# Altium footprint library E-Stall_lib.PcbLib: 112 footprints (part 7 of 7)
Each footprint in its own frame and in the unit in brackets; x right, y up, seen from the top. Pads: shape width x height; smd on the part's side, far side on the other; paste and mask are expansions set on the pad; w line width, h text height; cw(c..) or ccw(c..) is an arc to the next point about the centre after c.
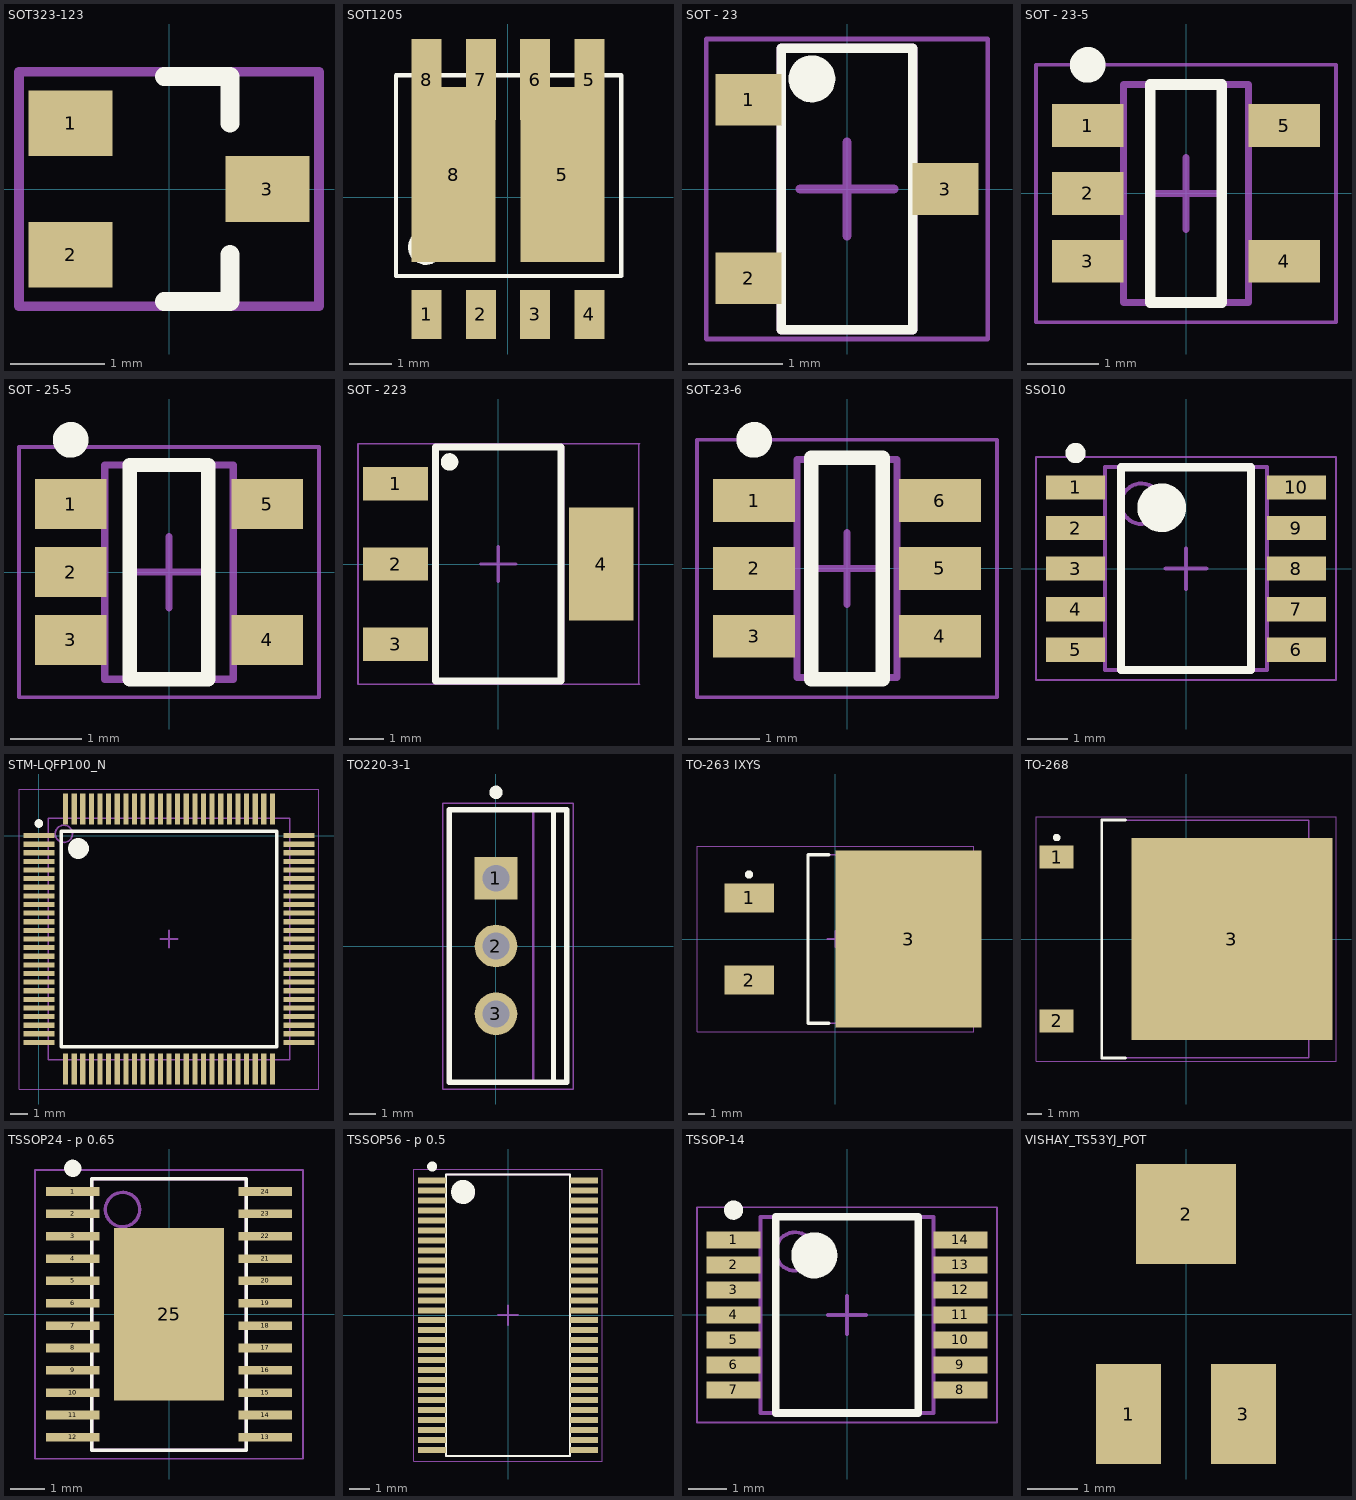
[diagram p6: the footprints below, top view; thin cyan lines are the x and y axes]

## SOT323-123 [mm] "SOT23 WITH A/K PIN NUMBERS"
pads (3):
  rect 0.9x0.7 smd: 1(-1.05,0.7) 2(-1.05,-0.7) 3(1.05,0)
Top Overlay:
  lines w0.2: -0.05,-1.2 0.65,-1.2 0.65,-0.7 ; -0.05,1.2 0.65,1.2 0.65,0.7
Mechanical 15:
  lines w0.102: -1.6,-1.25 1.6,-1.25 1.6,1.25 -1.6,1.25 -1.6,-1.25
3D body: height 1.33, standoff 1.3, extent -0.415,0.777 -0.162,1.03
3D body: height 0.22, standoff 0, extent -1.152,-0.908 -0.923,-0.502
3D body: height 0.62, standoff 0, extent -0.987,-0.908 -0.758,-0.502
3D body: height 0.62, standoff 0.4, extent -0.771,-0.908 -0.593,-0.502
3D body: height 0.62, standoff 0.4, extent -0.771,0.497 -0.593,0.903
3D body: height 0.62, standoff 0, extent -0.987,0.497 -0.758,0.903
3D body: height 0.22, standoff 0, extent -1.152,0.497 -0.923,0.903
3D body: height 1.3, standoff 0.1, extent -0.593,-1.175 0.6,1.175
3D body: height 0.62, standoff 0.4, extent 0.578,-0.218 0.756,0.188
3D body: height 0.62, standoff 0, extent 0.743,-0.218 0.972,0.188
3D body: height 0.22, standoff 0, extent 0.908,-0.218 1.137,0.188

## SOT1205 [mm]
pads (10):
  rect 0.7x1.15 smd mask+0.07: 1(-1.905,-2.75) 2(-0.635,-2.75) 3(0.635,-2.75) 4(1.905,-2.75)
  rect 1.968x4.1 smd paste-1 mask+0.07: 5(1.275,0.525) 8(-1.275,0.525)
  rect 0.7x1.9 smd mask+0.07: 5(1.905,2.75) 6(0.635,2.75) 7(-0.635,2.75) 8(-1.905,2.75)
Top Overlay:
  circle w0.1: c-1.925,-1.175 r0.365
  lines w0.1: -2.62,-1.85 -2.62,2.85 2.65,2.85 2.65,-1.85 -2.62,-1.85
Top Paste:
  rectangle: 0.625,-1.175 1.895,-0.175
  rectangle: 0.625,0.525 1.895,1.525
  rectangle: -1.925,-1.175 -0.655,-0.175
  rectangle: -1.92,0.525 -0.65,1.525
3D body "SOT1205.step": height 1.07, standoff -0.03, extent -2.55,-2.909 2.55,3.251

## SOT - 23 [mm] "SOT23, 3-Leads, Body 2,90x2,30mm, Pitch 0,95mm, IPC High Density"
height 1.1
pads (3):
  rect 0.7x0.55 smd: 1(-1.05,0.95) 2(-1.05,-0.95) 3(1.05,0)
Top Overlay:
  circle w0.25: c-0.375,1.175 r0.125
  lines w0.1: -0.7,-1.5 -0.7,1.5 0.7,1.5 0.7,-1.5 -0.7,-1.5
Mechanical 13:
  lines w0.1: -0.7,-1.5 0.7,-1.5 0.7,1.5 -0.7,1.5 -0.7,-1.5
Mechanical 15:
  lines w0.05: -1.5,-1.6 1.5,-1.6 1.5,1.6 -1.5,1.6 -1.5,-1.6
  lines w0.1: -0.5,0 0.5,0 ; 0,-0.5 0,0.5
3D body "SOT95P230X110-3L.step": height 1.1, standoff 0, extent -1.3,-1.5 1.3,1.5

## SOT - 23-5 [mm] "SOT23, 5-Leads, Body 2,90x2,80mm, Pitch 0,95mm, IPC Medium Density"
height 1.45
pads (5):
  rect 1x0.6 smd: 1(-1.375,0.95) 2(-1.375,0) 3(-1.375,-0.95) 4(1.375,-0.95) 5(1.375,0.95)
Top Overlay:
  circle w0.25: c-1.375,1.8 r0.125
  lines w0.15: -0.5,-1.525 0.5,-1.525 0.5,1.525 -0.5,1.525 -0.5,-1.525
Mechanical 13:
  lines w0.1: -0.875,-1.525 -0.875,1.525 0.875,1.525 0.875,-1.525 -0.875,-1.525
Mechanical 15:
  lines w0.05: -2.1,-1.8 -2.1,1.8 2.1,1.8 2.1,-1.8 -2.1,-1.8
  lines w0.1: -0.5,0 0.5,0 ; 0,-0.5 0,0.5
3D body "SOT - 23-5.STEP": height 1.44, standoff -0.01, extent -1.5,-1.525 1.5,1.525

## SOT - 25-5 [mm] "SOT25, 5-Leads"
height 1.3
pads (5):
  rect 1x0.7 smd: 1(-1.375,0.95) 2(-1.375,0) 3(-1.375,-0.95) 4(1.375,-0.95) 5(1.375,0.95)
Top Overlay:
  circle w0.25: c-1.375,1.85 r0.125
  lines w0.2: -0.55,-1.5 -0.55,1.5 0.55,1.5 0.55,-1.5 -0.55,-1.5
Mechanical 13:
  lines w0.1: -0.9,-1.5 0.9,-1.5 0.9,1.5 -0.9,1.5 -0.9,-1.5
Mechanical 15:
  lines w0.05: -2.1,-1.75 2.1,-1.75 2.1,1.75 -2.1,1.75 -2.1,-1.75
  lines w0.1: -0.5,0 0.5,0 ; 0,-0.5 0,0.5
3D body "SOT25-5.step": height 1.3, standoff 0, extent -1.5,-1.5 1.5,1.5

## SOT - 223 [mm] "SOT223, 4-Leads, Body 6,50x7,00mm (avg), Pitch 2,30mm, IPC High Density"
height 1.75
pads (4):
  rect 1.85x0.95 smd: 1(-2.95,2.3) 2(-2.95,0) 3(-2.95,-2.3)
  rect 1.85x3.25 smd: 4(2.95,0)
Top Overlay:
  circle w0.25: c-1.4,2.925 r0.125
  lines w0.2: -1.8,-3.35 1.8,-3.35 1.8,3.35 -1.8,3.35 -1.8,-3.35
Mechanical 13:
  lines w0.1: -1.85,-3.35 1.85,-3.35 1.85,3.35 -1.85,3.35 -1.85,-3.35
Mechanical 15:
  lines w0.05: 4.025,-3.45 4.025,3.45 ; 4.05,-3.45 -4.025,-3.45 -4.025,3.45 4.05,3.45
  lines w0.1: -0.5,0 0.5,0 ; 0,-0.5 0,0.5
3D body "SOT230P700X175-4L.step": height 1.75, standoff 0, extent -3.5,-3.35 3.5,3.35

## SOT-23-6 [mm] "SOT23, 6-Leads, Body 2,90x2,80mm, Pitch 0,95mm, IPC Medium Density"
height 1.45
pads (6):
  rect 1.15x0.6 smd: 1(-1.3,0.95) 2(-1.3,0) 3(-1.3,-0.95) 4(1.3,-0.95) 5(1.3,0) 6(1.3,0.95)
Top Overlay:
  circle w0.25: c-1.3,1.8 r0.125
  lines w0.2: -0.5,-1.55 0.5,-1.55 0.5,1.55 -0.5,1.55 -0.5,-1.55
Mechanical 13:
  lines w0.1: -0.7,-1.525 -0.7,1.525 0.7,1.525 0.7,-1.525 -0.7,-1.525
Mechanical 15:
  lines w0.05: -2.1,-1.8 -2.1,1.8 2.1,1.8 2.1,-1.8 -2.1,-1.8
  lines w0.1: -0.5,0 0.5,0 ; 0,-0.5 0,0.5
3D body "SOT-23-6.step": height 1.45, standoff 0, extent -1.5,-1.525 1.5,1.525

## SSO10 [mm] "SSO10, 10-Leads, Body 4,90x3,90mm, Pitch 1,00mm, IPC Medium Density"
height 1.75
pads (10):
  rect 1.45x0.6 smd: 1(-2.725,2) 2(-2.725,1) 3(-2.725,0) 4(-2.725,-1) 5(-2.725,-2) 6(2.725,-2) 7(2.725,-1) 8(2.725,0) 9(2.725,1) 10(2.725,2)
Top Overlay:
  circle w0.25: c-2.725,2.85 r0.125
  circle w0.6: c-0.6,1.5 r0.3
  lines w0.2: -1.6,-2.5 -1.6,2.5 1.6,2.5 1.6,-2.5 -1.6,-2.5
Mechanical 13:
  circle w0.1: c-1.1,1.6 r0.5
  lines w0.1: -2,-2.5 -2,2.5 2,2.5 2,-2.5 -2,-2.5
Mechanical 15:
  lines w0.05: -3.7,-2.75 -3.7,2.75 3.7,2.75 3.7,-2.75 -3.7,-2.75
  lines w0.1: -0.5,0 0.5,0 ; 0,-0.5 0,0.5
3D body "SSO10.step": height 1.75, standoff 0, extent -3,-2.5 3,2.5

## STM-LQFP100_N [mm]
pads (100):
  rect 1.8x0.3 smd mask+0.05: 1(0,0) 2(0,-0.5) 3(0,-1) 4(0,-1.5) 5(0,-2) 6(0,-2.5) 7(0,-3) 8(0,-3.5) 9(0,-4) 10(0,-4.5) 11(0,-5) 12(0,-5.5) 13(0,-6) 14(0,-6.5) 15(0,-7) 16(0,-7.5) 17(0,-8) 18(0,-8.5) 19(0,-9) 20(0,-9.5) 21(0,-10) 22(0,-10.5) 23(0,-11) 24(0,-11.5) 25(0,-12) 51(15.1,-12) 52(15.1,-11.5) 53(15.1,-11) 54(15.1,-10.5) 55(15.1,-10) 56(15.1,-9.5) 57(15.1,-9) 58(15.1,-8.5) 59(15.1,-8) 60(15.1,-7.5) 61(15.1,-7) 62(15.1,-6.5) 63(15.1,-6) 64(15.1,-5.5) 65(15.1,-5) 66(15.1,-4.5) 67(15.1,-4) 68(15.1,-3.5) 69(15.1,-3) 70(15.1,-2.5) 71(15.1,-2) 72(15.1,-1.5) 73(15.1,-1) 74(15.1,-0.5) 75(15.1,0)
  rect 0.3x1.8 smd mask+0.05: 26(1.55,-13.55) 27(2.05,-13.55) 28(2.55,-13.55) 29(3.05,-13.55) 30(3.55,-13.55) 31(4.05,-13.55) 32(4.55,-13.55) 33(5.05,-13.55) 34(5.55,-13.55) 35(6.05,-13.55) 36(6.55,-13.55) 37(7.05,-13.55) 38(7.55,-13.55) 39(8.05,-13.55) 40(8.55,-13.55) 41(9.05,-13.55) 42(9.55,-13.55) 43(10.05,-13.55) 44(10.55,-13.55) 45(11.05,-13.55) 46(11.55,-13.55) 47(12.05,-13.55) 48(12.55,-13.55) 49(13.05,-13.55) 50(13.55,-13.55) 76(13.55,1.55) 77(13.05,1.55) 78(12.55,1.55) 79(12.05,1.55) 80(11.55,1.55) 81(11.05,1.55) 82(10.55,1.55) 83(10.05,1.55) 84(9.55,1.55) 85(9.05,1.55) 86(8.55,1.55) 87(8.05,1.55) 88(7.55,1.55) 89(7.05,1.55) 90(6.55,1.55) 91(6.05,1.55) 92(5.55,1.55) 93(5.05,1.55) 94(4.55,1.55) 95(4.05,1.55) 96(3.55,1.55) 97(3.05,1.55) 98(2.55,1.55) 99(2.05,1.55) 100(1.55,1.55)
Top Overlay:
  circle w0.6: c2.3,-0.75 r0.3
  circle w0.25: c0,0.7 r0.125
  lines w0.2: 1.3,-12.25 13.8,-12.25 13.8,0.25 1.3,0.25 1.3,-12.25
Mechanical 13:
  circle w0.1: c1.45,0.1 r0.5
  lines w0.1: 0.55,-13 14.55,-13 14.55,1 0.55,1 0.55,-13
Mechanical 15:
  lines w0.05: -1.15,-14.7 16.25,-14.7 16.25,2.7 -1.15,2.7 -1.15,-14.7
  lines w0.1: 7.05,-6 8.05,-6 ; 7.55,-6.5 7.55,-5.5
3D body: height 1.6, standoff 0.05, extent 0.55,-13 14.55,1

## TO220-3-1 [mm] "FM, 3-Leads, Body 10x4.4mm, Pitch 2.54mm"
height 20.7
pads (3):
  rect 1.6x1.6 hole 1: 1(0,2.54)
  round 1.6 hole 1: 2(0,0) 3(0,-2.54)
Top Overlay:
  circle w0.25: c0,5.75 r0.125
  lines w0.2: 2.15,-5.1 2.15,5.1 ; -1.75,-5.1 2.65,-5.1 2.65,5.1 -1.75,5.1 -1.75,-5.1
Mechanical 13:
  lines w0.1: 1.4,-5.1 1.4,5.1 ; -1.75,-5.1 -1.75,5.1 2.65,5.1 2.65,-5.1 -1.75,-5.1
Mechanical 15:
  lines w0.05: -2,-5.35 -2,5.35 2.9,5.35 2.9,-5.35 -2,-5.35
  lines w0.1: -0.5,0 0.5,0 ; 0,-0.5 0,0.5
3D body: height 4.35, standoff 0, extent -0.25,2.015 0.25,3.065
3D body: height 0, standoff -1.6, extent -0.25,2.165 0.25,2.915
3D body: height 4.35, standoff 0, extent -0.25,-0.525 0.25,0.525
3D body: height 0, standoff -1.6, extent -0.25,-0.375 0.25,0.375
3D body: height 4.35, standoff 0, extent -0.25,-3.065 0.25,-2.015
3D body: height 0, standoff -1.6, extent -0.25,-2.915 0.25,-2.165
3D body: height 14.3, standoff 4.35, extent -1.75,-5.1 2.65,5.1
3D body: height 16.08, standoff 14.3, extent 1.4,-4.95 2.65,4.95
3D body: height 16.12, standoff 16.08, extent 1.4,0.356 2.65,4.95
3D body: height 16.12, standoff 16.08, extent 1.4,-4.95 2.65,-0.356
3D body: height 19.73, standoff 19.69, extent 1.4,0.356 2.65,4.95
3D body: height 19.73, standoff 19.69, extent 1.4,-4.95 2.65,-0.356
3D body: height 16.22, standoff 16.11, extent 1.4,0.698 2.65,4.95
3D body: height 16.22, standoff 16.11, extent 1.4,-4.95 2.65,-0.698
3D body: height 19.69, standoff 19.59, extent 1.4,0.698 2.65,4.95
3D body: height 19.69, standoff 19.59, extent 1.4,-4.95 2.65,-0.698
3D body: height 16.39, standoff 16.21, extent 1.4,1.014 2.65,4.95
3D body: height 16.39, standoff 16.21, extent 1.4,-4.95 2.65,-1.014
3D body: height 19.59, standoff 19.42, extent 1.4,1.014 2.65,4.95
3D body: height 19.59, standoff 19.42, extent 1.4,-4.95 2.65,-1.014
3D body: height 16.61, standoff 16.38, extent 1.4,1.29 2.65,4.95
3D body: height 16.61, standoff 16.38, extent 1.4,-4.95 2.65,-1.29
3D body: height 19.42, standoff 19.19, extent 1.4,1.29 2.65,4.95
3D body: height 19.42, standoff 19.19, extent 1.4,-4.95 2.65,-1.29
3D body: height 16.89, standoff 16.61, extent 1.4,1.517 2.65,4.95
3D body: height 16.89, standoff 16.61, extent 1.4,-4.95 2.65,-1.517
3D body: height 19.2, standoff 18.91, extent 1.4,1.517 2.65,4.95
3D body: height 19.2, standoff 18.91, extent 1.4,-4.95 2.65,-1.517
3D body: height 17.21, standoff 16.89, extent 1.4,1.686 2.65,4.95
3D body: height 17.21, standoff 16.89, extent 1.4,-4.95 2.65,-1.686
3D body: height 18.92, standoff 18.6, extent 1.4,1.686 2.65,4.95
3D body: height 18.92, standoff 18.6, extent 1.4,-4.95 2.65,-1.686
3D body: height 17.55, standoff 17.2, extent 1.4,1.79 2.65,4.95
3D body: height 17.55, standoff 17.2, extent 1.4,-4.95 2.65,-1.79
3D body: height 18.6, standoff 18.26, extent 1.4,1.79 2.65,4.95
3D body: height 18.6, standoff 18.26, extent 1.4,-4.95 2.65,-1.79
3D body: height 17.9, standoff 17.54, extent 1.4,1.825 2.65,4.95
3D body: height 17.9, standoff 17.54, extent 1.4,-4.95 2.65,-1.825
3D body: height 18.26, standoff 17.9, extent 1.4,1.825 2.65,4.95
3D body: height 18.26, standoff 17.9, extent 1.4,-4.95 2.65,-1.825
3D body: height 20.7, standoff 19.73, extent 1.4,-4.95 2.65,4.95

## TO-263 IXYS [mm] "IXYS TO-263 IXTA"
height 4.83
pads (3):
  rect 3.05x1.78 smd: 1(-5.335,2.54) 2(-5.335,-2.54)
  rect 9.02x10.92 smd: 3(4.51,0)
Top Overlay:
  circle w0.25: c-5.335,3.98 r0.125
  lines w0.2: -0.4,-5.2 -1.7,-5.2 -1.7,5.2 -0.4,5.2
Top Assembly:
  lines w0.1: -1.7,-5.2 -1.7,5.2 7.95,5.2 7.95,-5.2 -1.7,-5.2
Top Courtyard:
  lines w0.05: -8.55,-5.725 -8.55,5.725 8.55,5.725 8.55,-5.725 -8.55,-5.725
  lines w0.1: -0.5,0 0.5,0 ; 0,-0.5 0,0.5
3D body "TO-263 IXYS.step": height 4.83, standoff 0, extent -6.477,-5.193 8.768,5.207

## TO-268 [mm] "D3-PAK, 3-Pads, Body 10,10x11,39mm (max), IPC Medium Density"
height 5.1
pads (3):
  rect 2.3x1.55 smd: 1(-8.75,5.54) 2(-8.75,-5.54)
  rect 13.6x13.7 smd: 3(3.1,0)
Top Overlay:
  circle w0.25: c-8.75,6.865 r0.125
  lines w0.2: -4.1,-8.05 -5.7,-8.05 -5.7,8.05 -4.1,8.05
Mechanical 13:
  lines w0.1: -5.7,-8.025 8.3,-8.025 8.3,8.025 -5.7,8.025 -5.7,-8.025
Mechanical 15:
  lines w0.05: -10.15,-8.275 10.15,-8.275 10.15,8.275 -10.15,8.275 -10.15,-8.275
  lines w0.1: -0.5,0 0.5,0 ; 0,-0.5 0,0.5
3D body "TO-268.step": height 5.35, standoff 0, extent -9.3,-8 9.6,8.05

## TSSOP24 - p 0.65 [mm]
pads (25):
  rect 1.55x0.25 smd: 1(-2.8,3.575) 2(-2.8,2.925) 3(-2.8,2.275) 4(-2.8,1.625) 5(-2.8,0.975) 6(-2.8,0.325) 7(-2.8,-0.325) 8(-2.8,-0.975) 9(-2.8,-1.625) 10(-2.8,-2.275) 11(-2.8,-2.925) 12(-2.8,-3.575) 13(2.8,-3.575) 14(2.8,-2.925) 15(2.8,-2.275) 16(2.8,-1.625) 17(2.8,-0.975) 18(2.8,-0.325) 19(2.8,0.325) 20(2.8,0.975) 21(2.8,1.625) 22(2.8,2.275) 23(2.8,2.925) 24(2.8,3.575)
  rect 3.2x5.02 smd paste+0: 25(0,0)
Top Overlay:
  circle w0.25: c-2.8,4.25 r0.125
  lines w0.1: -2.25,-3.95 -2.25,3.95 2.25,3.95 2.25,-3.95 -2.25,-3.95
Mechanical 13:
  circle w0.1: c-1.35,3.05 r0.5
  lines w0.1: -2.25,-3.95 -2.25,3.95 2.25,3.95 2.25,-3.95 -2.25,-3.95
Mechanical 15:
  lines w0.05: -3.9,-4.2 -3.9,4.2 3.9,4.2 3.9,-4.2 -3.9,-4.2
  lines w0.1: -0.5,0 0.5,0 ; 0,-0.5 0,0.5
3D body: height 1.2, standoff 0, extent 0,0 0,0
3D body "PW0024A.stp": height 1.13, standoff 0, extent -3.2,-3.9 3.2,3.9

## TSSOP56 - p 0.5 [mm]
height 1.1
pads (56):
  rect 1.4x0.3 smd mask+0.01: 1(-3.8,6.75) 2(-3.8,6.25) 3(-3.8,5.75) 4(-3.8,5.25) 5(-3.8,4.75) 6(-3.8,4.25) 7(-3.8,3.75) 8(-3.8,3.25) 9(-3.8,2.75) 10(-3.8,2.25) 11(-3.8,1.75) 12(-3.8,1.25) 13(-3.8,0.75) 14(-3.8,0.25) 15(-3.8,-0.25) 16(-3.8,-0.75) 17(-3.8,-1.25) 18(-3.8,-1.75) 19(-3.8,-2.25) 20(-3.8,-2.75) 21(-3.8,-3.25) 22(-3.8,-3.75) 23(-3.8,-4.25) 24(-3.8,-4.75) 25(-3.8,-5.25) 26(-3.8,-5.75) 27(-3.8,-6.25) 28(-3.8,-6.75) 29(3.8,-6.75) 30(3.8,-6.25) 31(3.8,-5.75) 32(3.8,-5.25) 33(3.8,-4.75) 34(3.8,-4.25) 35(3.8,-3.75) 36(3.8,-3.25) 37(3.8,-2.75) 38(3.8,-2.25) 39(3.8,-1.75) 40(3.8,-1.25) 41(3.8,-0.75) 42(3.8,-0.25) 43(3.8,0.25) 44(3.8,0.75) 45(3.8,1.25) 46(3.8,1.75) 47(3.8,2.25) 48(3.8,2.75) 49(3.8,3.25) 50(3.8,3.75) 51(3.8,4.25) 52(3.8,4.75) 53(3.8,5.25) 54(3.8,5.75) 55(3.8,6.25) 56(3.8,6.75)
Top Overlay:
  circle w0.6: c-2.25,6.175 r0.3
  circle w0.25: c-3.8,7.45 r0.125
  lines w0.1: -3.1,-7.05 -3.1,7.05 3.1,7.05 3.1,-7.05 -3.1,-7.05
Mechanical 13:
  circle w0.1: c-2.2,6.15 r0.5
  lines w0.1: -3.1,-7.05 3.1,-7.05 3.1,7.05 -3.1,7.05 -3.1,-7.05
Mechanical 15:
  lines w0.05: -4.725,-7.3 4.725,-7.3 4.725,7.3 -4.725,7.3 -4.725,-7.3
  lines w0.1: -0.5,0 0.5,0 ; 0,-0.5 0,0.5
3D body "TSSOP56.stp": height 1.1, standoff 0, extent -4.06,-7 4.061,7

## TSSOP-14 [mm] "TSOP, 14-Leads, Body 5,00x4,40mm, Pitch 0,65mm, MO-153"
height 1.2
pads (14):
  rect 1.4x0.45 smd: 1(-2.95,1.95) 2(-2.95,1.3) 3(-2.95,0.65) 4(-2.95,0) 5(-2.95,-0.65) 6(-2.95,-1.3) 7(-2.95,-1.95) 8(2.95,-1.95) 9(2.95,-1.3) 10(2.95,-0.65) 11(2.95,0) 12(2.95,0.65) 13(2.95,1.3) 14(2.95,1.95)
Top Overlay:
  circle w0.6: c-0.85,1.55 r0.3
  circle w0.25: c-2.95,2.725 r0.125
  lines w0.2: -1.85,-2.55 1.85,-2.55 1.85,2.55 -1.85,2.55 -1.85,-2.55
Top Assembly:
  circle w0.1: c-1.35,1.65 r0.5
  lines w0.1: -2.25,-2.55 2.25,-2.55 2.25,2.55 -2.25,2.55 -2.25,-2.55
Top Courtyard:
  lines w0.05: -3.9,-2.8 3.9,-2.8 3.9,2.8 -3.9,2.8 -3.9,-2.8
  lines w0.1: -0.5,0 0.5,0 ; 0,-0.5 0,0.5
3D body "TSSOP-14.step": height 1.2, standoff 0, extent -3.2,-2.55 3.2,2.55

## VISHAY_TS53YJ_POT [mm] "SMD Potentiometer VISHAY TS53YJ"
height 2.7
pads (3):
  rect 1.3x2 smd: 1(-1.15,-2) 3(1.15,-2)
  rect 2x2 smd: 2(0,2)
3D body "pvg3a_mod.stp": height 2.73, standoff 0, extent -2.498,-2.498 2.498,2.498